# Altium integrated library Lattice CPLD ispLSI.IntLib: 471 symbols (part 16 of 26) (continued)
## ispLSI3320-70LB320
designator U?
In-System Programmable High-Density PLD; Published: 23-Sep-2002; LatestRevisionDate: 13-Apr-2006; LatestRevisionNote: IPC-7351 Footprint Added.; DatasheetVersion: May-1999; PackageVersion: pkg_32, Aug-2005; PackageReference: SBGA320; Publisher: Altium Limited; PackageDescription: 320-Ball Super Ball Grid Array (SBGA320); ComponentLink1Description: Manufacturer Link; ComponentLink1URL: http://www.latticesemi.com/products/mature/index.cfm; ComponentLink2Description: Datasheet; ComponentLink2URL: http://www.latticesemi.com/lit/docs/datasheets/cpld/3320.pdf
footprint SBGA320 (BGA, 320-Leads, Body 31x31mm, Pitch 1.27mm)
3D model 3320-SBGA320 (320-Ball Super Ball Grid Array (SBGA320))
part A pins: A4 I/O144 (io), A5 I/O146 (io), A7 I/O151 (io), A8 I/O154 (io), A10 I/O157 (io), A12 MODE/TMS (in), A13 ~{TRST} (in), A15 I/O1 (io), A17 I/O5 (io), A18 I/O8 (io), A19 I/O9 (io), A21 I/O14 (io), A22 I/O16 (io), AA1 I/O104 (io), AA2 I/O103 (io), AA3 I/O101 (io), AA7 I/O92 (io), AA9 I/O87 (io), AA10 I/O84 (io), AA12 Y0 (in), AA13 Y3 (in), AA15 I/O75 (io), AA16 I/O72 (io), AA17 I/O69 (io), AA20 I/O62 (io), AA22 I/O57 (io), AA23 I/O55 (io), AA24 I/O54 (io), AB2 I/O100 (io), AB3 I/O99 (io), AB4 I/O97 (io), AB6 I/O93 (io), AB7 I/O90 (io), AB9 I/O86 (io), AB10 I/O83 (io), AB11 I/O80 (io), AB13 Y2 (in), AB14 I/O78 (io), AB15 I/O76 (io), AB16 I/O73 (io), AB18 I/O68 (io), AB19 I/O65 (io), AB21 I/O61 (io), AB22 I/O59 (io), AB23 I/O58 (io), AB24 I/O56 (io), AC3 I/O98 (io), AC4 I/O95 (io), AC6 I/O91 (io), AC10 I/O82 (io), AC11 GOE1 (in), AC13 Y1 (in), AC14 I/O79 (io), AC18 I/O70 (io), AC19 I/O67 (io), AC21 I/O63 (io), AC22 I/O60 (io), AD3 I/O96 (io), AD4 I/O94 (io), AD6 I/O89 (io), AD7 I/O88 (io), AD8 I/O85 (io), AD10 I/O81 (io), AD12 GOE0 (in), AD13 Y4 (in), AD15 I/O77 (io), AD17 I/O74 (io), AD18 I/O71 (io), AD20 I/O66 (io), AD21 I/O64 (io), B3 I/O140 (io), B4 I/O143 (io), B6 I/O147 (io), B7 I/O150 (io), B11 I/O159 (io), B12 ~{ispEN}/BSCAN (in), B14 TOE (in), B15 I/O2 (io), B19 I/O11 (io), B21 I/O15 (io), B22 I/O18 (io), C1 I/O137 (io), C2 I/O139 (io), C4 I/O141 (io), C6 I/O145 (io), C7 I/O148 (io), C9 I/O153 (io), C10 I/O156 (io), C11 I/O158 (io), C12 SDI/TDI (in), C14 I/O0 (io), C15 I/O3 (io), C16 I/O6 (io), C18 I/O10 (io), C19 I/O13 (io), C21 I/O17 (io), C22 I/O19 (io), C23 I/O20 (io), D1 I/O135 (io), D2 I/O136 (io), D3 I/O138 (io), D5 I/O142 (io), D8 I/O149 (io), D9 I/O152 (io), D10 I/O155 (io), D12 SCLK/TCK (in), D13 ~{RESET} (in), D15 I/O4 (io), D16 I/O7 (io), D18 I/O12 (io), D22 I/O21 (io), D23 I/O23 (io), D24 I/O24 (io), E21 I/O22 (io), E24 I/O26 (io), F1 I/O130 (io), F2 I/O132 (io), F3 I/O134 (io), F22 I/O25 (io), F23 I/O27 (io), G1 I/O129 (io), G3 I/O131 (io), G4 I/O133 (io), G22 I/O28 (io), G24 I/O30 (io), H1 I/O126 (io), H21 I/O29 (io), H24 I/O33 (io), J3 I/O127 (io), J4 I/O128 (io), J21 I/O31 (io), J22 I/O32 (io), K1 I/O123 (io), K2 I/O124 (io), K4 I/O125 (io), K21 I/O34 (io), K22 I/O35 (io), K24 I/O36 (io), L2 I/O121 (io), L3 I/O122 (io), L22 I/O37 (io), L23 I/O38 (io), M1 I/O120 (io), M4 SDO/TDO (out), M24 I/O39 (io), N1 I/O119 (io), P2 I/O118 (io), P3 I/O117 (io), P22 I/O41 (io), P23 I/O40 (io), R1 I/O116 (io), R3 I/O115 (io), R4 I/O114 (io), R21 I/O44 (io), R23 I/O43 (io), R24 I/O42 (io), T3 I/O112 (io), T4 I/O111 (io), T21 I/O47 (io), T22 I/O46 (io), U1 I/O113 (io), U4 I/O109 (io), U24 I/O45 (io), V1 I/O110 (io), V3 I/O108 (io), V21 I/O52 (io), V22 I/O50 (io), V24 I/O48 (io), W2 I/O107 (io), W3 I/O105 (io), W22 I/O53 (io), W23 I/O51 (io), W24 I/O49 (io), Y1 I/O106 (io), Y4 I/O102 (io)
part B pins: A1 NC, A2 NC, A3 NC, A6 NC, A9 NC, A11 NC, A14 NC, A16 GND (power), A20 NC, A23 NC, A24 NC, AA4 VCC (power), AA5 NC, AA6 GND (power), AA8 NC, AA11 NC, AA14 NC, AA18 NC, AA19 GND (power), AA21 VCC (power), AB1 NC, AB5 NC, AB8 NC, AB12 NC, AB17 GND (power), AB20 NC, AC1 NC, AC2 NC, AC5 NC, AC7 VCC (power), AC8 NC, AC9 NC, AC12 GND (power), AC15 VCC (power), AC16 NC, AC17 NC, AC20 NC, AC23 NC, AC24 NC, AD1 NC, AD2 NC, AD5 NC, AD9 GND (power), AD11 NC, AD14 NC, AD16 NC, AD19 NC, AD22 NC, AD23 NC, AD24 NC, B1 NC, B2 NC, B5 NC, B8 NC, B9 NC, B10 VCC (power), B13 GND (power), B16 NC, B17 NC, B18 VCC (power), B20 NC, B23 NC, B24 NC, C3 VCC (power), C5 NC, C8 GND (power), C13 NC, C17 NC, C20 NC, C24 NC, D4 VCC (power), D6 GND (power), D7 NC, D11 NC, D14 NC, D17 NC, D19 GND (power), D20 NC, D21 VCC (power), E1 NC, E2 NC, E3 NC, E4 NC, E22 NC, E23 NC, F4 GND (power), F21 GND (power), F24 NC, G2 VCC (power), G21 NC, G23 NC, H2 NC, H3 NC, H4 NC, H22 GND (power), H23 NC, J1 GND (power), J2 NC, J23 NC, J24 NC, K3 NC, K23 VCC (power), L1 NC, L4 NC, L21 NC, L24 NC, M2 GND (power), M3 NC, M21 NC, M22 NC, M23 NC, N2 NC, N3 NC, N4 NC, N21 NC, N22 NC, N23 GND (power), N24 NC, P1 NC, P4 NC, P21 NC, P24 NC, R2 VCC (power), R22 NC, T1 NC, T2 NC, T23 NC, T24 GND (power), U2 NC, U3 GND (power), U21 NC, U22 NC, U23 NC, V2 NC, V4 NC, V23 VCC (power), W1 NC, W4 GND (power), W21 GND (power), Y2 NC, Y3 NC, Y21 NC, Y22 NC, Y23 NC, Y24 NC
part A text: J; I; H; A; G; B; F; C; E; D

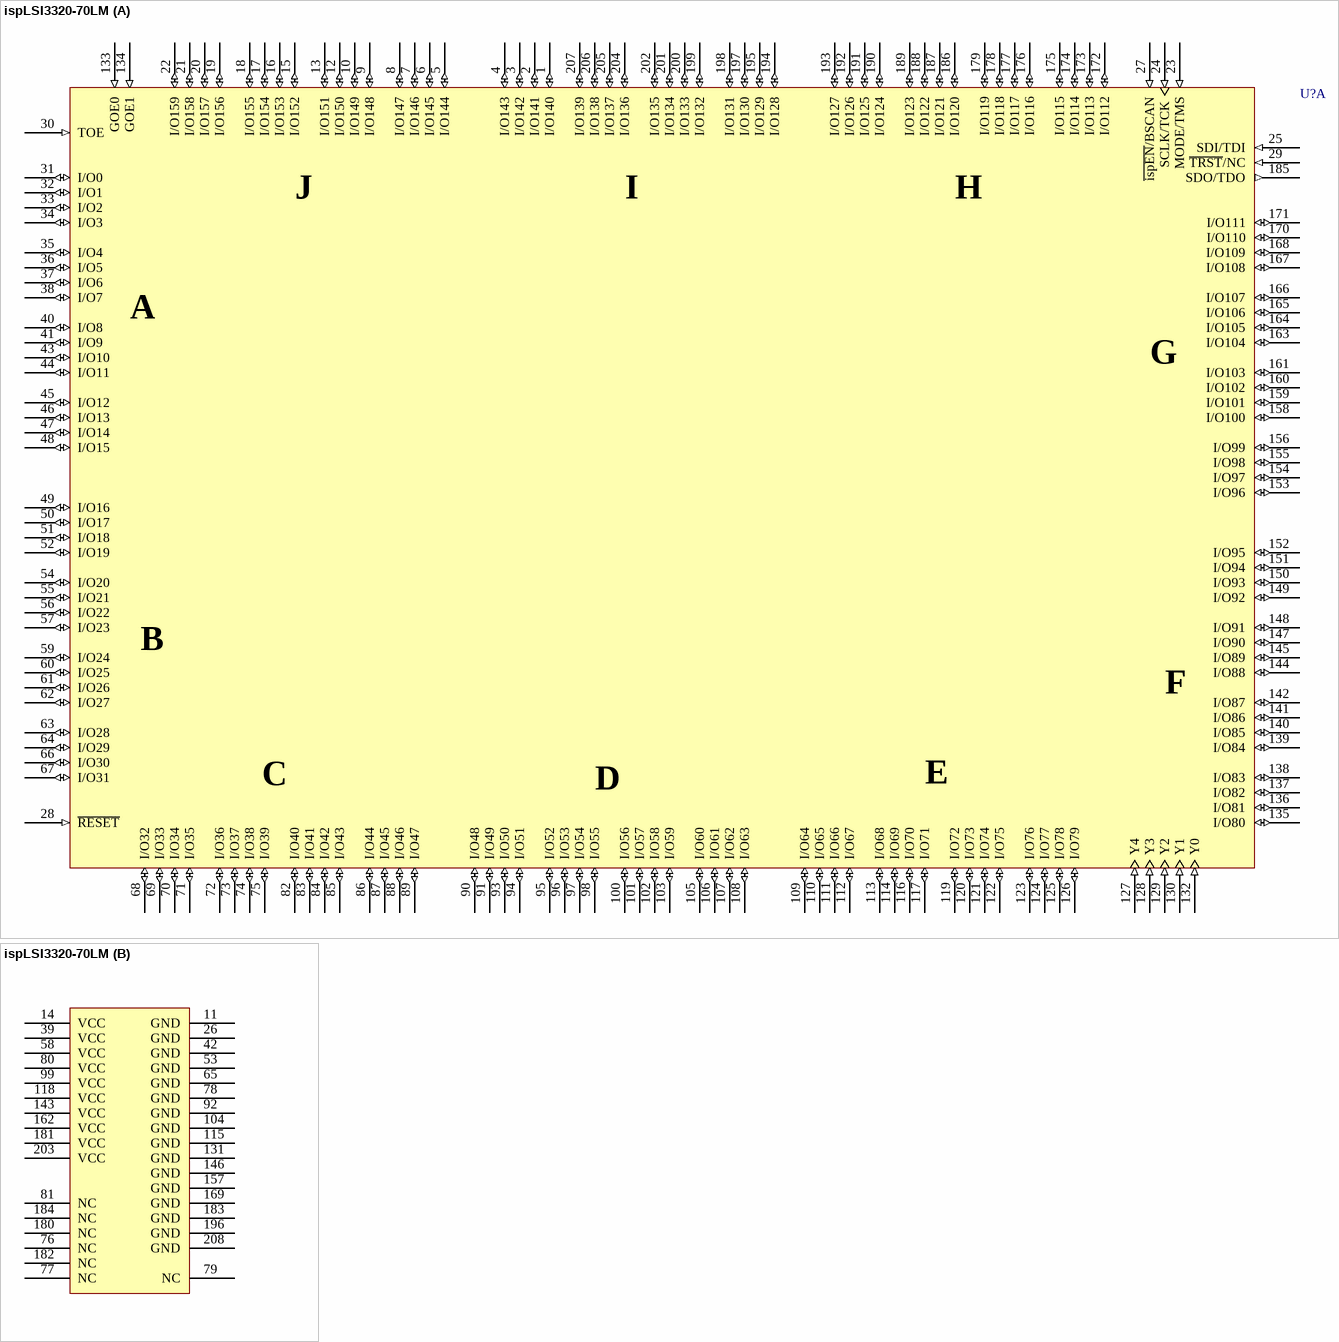
[diagram p149: symbol ispLSI3320-70LM]

## ispLSI3320-70LM
designator U?
In-System Programmable High-Density PLD; Published: 23-Sep-2002; LatestRevisionDate: 13-Apr-2006; LatestRevisionNote: IPC-7351 Footprint Added.; DatasheetVersion: May-1999; PackageVersion: Sep-2000; PackageReference: MQFP208; Publisher: Altium Limited; PackageDescription: 208-Pin Shrink Quad Flat Pack 0.5 mm Pitch; ComponentLink1Description: Manufacturer Link; ComponentLink1URL: http://www.latticesemi.com/products/mature/index.cfm; ComponentLink2Description: Datasheet; ComponentLink2URL: http://www.latticesemi.com/lit/docs/datasheets/cpld/3320.pdf
footprint MQFP208_N (Shrink QFP, 208-Leads, Body 27.7x27.7mm, Pitch 0.5mm, IPC Medium Density)
footprint MQFP208_L (Shrink QFP, 208-Leads, Body 27.7x27.7mm, Pitch 0.5mm, IPC High Density)
footprint MQFP208_M (Shrink QFP, 208-Leads, Body 27.7x27.7mm, Pitch 0.5mm, IPC Low Density)
3D model 3320-MQFP208 (208-Pin Shrink Quad Flat Pack 0.5 mm Pitch)
part A pins: 1 I/O140 (io), 2 I/O141 (io), 3 I/O142 (io), 4 I/O143 (io), 5 I/O144 (io), 6 I/O145 (io), 7 I/O146 (io), 8 I/O147 (io), 9 I/O148 (io), 10 I/O149 (io), 12 I/O150 (io), 13 I/O151 (io), 15 I/O152 (io), 16 I/O153 (io), 17 I/O154 (io), 18 I/O155 (io), 19 I/O156 (io), 20 I/O157 (io), 21 I/O158 (io), 22 I/O159 (io), 23 MODE/TMS (in), 24 SCLK/TCK (in), 25 SDI/TDI (in), 27 ~{ispEN}/BSCAN (in), 28 ~{RESET} (in), 29 ~{TRST}/NC (in), 30 TOE (in), 31 I/O0 (io), 32 I/O1 (io), 33 I/O2 (io), 34 I/O3 (io), 35 I/O4 (io), 36 I/O5 (io), 37 I/O6 (io), 38 I/O7 (io), 40 I/O8 (io), 41 I/O9 (io), 43 I/O10 (io), 44 I/O11 (io), 45 I/O12 (io), 46 I/O13 (io), 47 I/O14 (io), 48 I/O15 (io), 49 I/O16 (io), 50 I/O17 (io), 51 I/O18 (io), 52 I/O19 (io), 54 I/O20 (io), 55 I/O21 (io), 56 I/O22 (io), 57 I/O23 (io), 59 I/O24 (io), 60 I/O25 (io), 61 I/O26 (io), 62 I/O27 (io), 63 I/O28 (io), 64 I/O29 (io), 66 I/O30 (io), 67 I/O31 (io), 68 I/O32 (io), 69 I/O33 (io), 70 I/O34 (io), 71 I/O35 (io), 72 I/O36 (io), 73 I/O37 (io), 74 I/O38 (io), 75 I/O39 (io), 82 I/O40 (io), 83 I/O41 (io), 84 I/O42 (io), 85 I/O43 (io), 86 I/O44 (io), 87 I/O45 (io), 88 I/O46 (io), 89 I/O47 (io), 90 I/O48 (io), 91 I/O49 (io), 93 I/O50 (io), 94 I/O51 (io), 95 I/O52 (io), 96 I/O53 (io), 97 I/O54 (io), 98 I/O55 (io), 100 I/O56 (io), 101 I/O57 (io), 102 I/O58 (io), 103 I/O59 (io), 105 I/O60 (io), 106 I/O61 (io), 107 I/O62 (io), 108 I/O63 (io), 109 I/O64 (io), 110 I/O65 (io), 111 I/O66 (io), 112 I/O67 (io), 113 I/O68 (io), 114 I/O69 (io), 116 I/O70 (io), 117 I/O71 (io), 119 I/O72 (io), 120 I/O73 (io), 121 I/O74 (io), 122 I/O75 (io), 123 I/O76 (io), 124 I/O77 (io), 125 I/O78 (io), 126 I/O79 (io), 127 Y4 (in), 128 Y3 (in), 129 Y2 (in), 130 Y1 (in), 132 Y0 (in), 133 GOE0 (in), 134 GOE1 (in), 135 I/O80 (io), 136 I/O81 (io), 137 I/O82 (io), 138 I/O83 (io), 139 I/O84 (io), 140 I/O85 (io), 141 I/O86 (io), 142 I/O87 (io), 144 I/O88 (io), 145 I/O89 (io), 147 I/O90 (io), 148 I/O91 (io), 149 I/O92 (io), 150 I/O93 (io), 151 I/O94 (io), 152 I/O95 (io), 153 I/O96 (io), 154 I/O97 (io), 155 I/O98 (io), 156 I/O99 (io), 158 I/O100 (io), 159 I/O101 (io), 160 I/O102 (io), 161 I/O103 (io), 163 I/O104 (io), 164 I/O105 (io), 165 I/O106 (io), 166 I/O107 (io), 167 I/O108 (io), 168 I/O109 (io), 170 I/O110 (io), 171 I/O111 (io), 172 I/O112 (io), 173 I/O113 (io), 174 I/O114 (io), 175 I/O115 (io), 176 I/O116 (io), 177 I/O117 (io), 178 I/O118 (io), 179 I/O119 (io), 185 SDO/TDO (out), 186 I/O120 (io), 187 I/O121 (io), 188 I/O122 (io), 189 I/O123 (io), 190 I/O124 (io), 191 I/O125 (io), 192 I/O126 (io), 193 I/O127 (io), 194 I/O128 (io), 195 I/O129 (io), 197 I/O130 (io), 198 I/O131 (io), 199 I/O132 (io), 200 I/O133 (io), 201 I/O134 (io), 202 I/O135 (io), 204 I/O136 (io), 205 I/O137 (io), 206 I/O138 (io), 207 I/O139 (io)
part B pins: 11 GND (power), 14 VCC (power), 26 GND (power), 39 VCC (power), 42 GND (power), 53 GND (power), 58 VCC (power), 65 GND (power), 76 NC, 77 NC, 78 GND (power), 79 NC, 80 VCC (power), 81 NC, 92 GND (power), 99 VCC (power), 104 GND (power), 115 GND (power), 118 VCC (power), 131 GND (power), 143 VCC (power), 146 GND (power), 157 GND (power), 162 VCC (power), 169 GND (power), 180 NC, 181 VCC (power), 182 NC, 183 GND (power), 184 NC, 196 GND (power), 203 VCC (power), 208 GND (power)
part A text: J; I; H; A; G; B; F; C; E; D

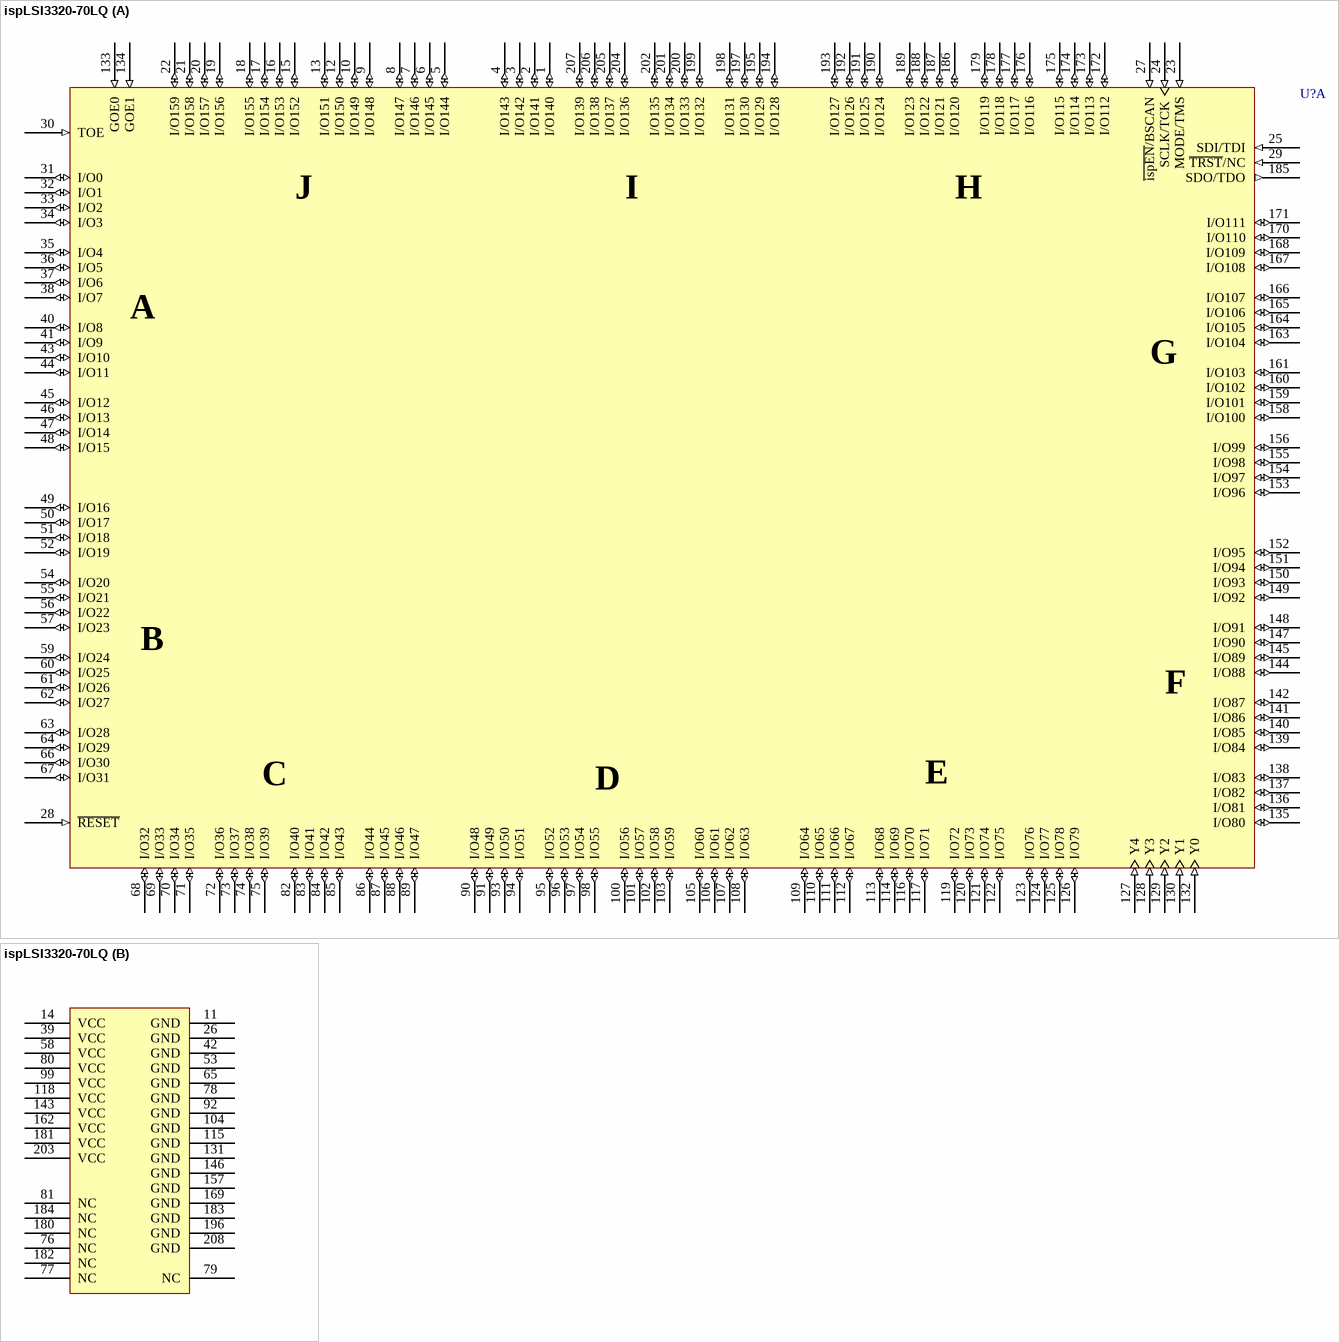
[diagram p150: symbol ispLSI3320-70LQ]

## ispLSI3320-70LQ
designator U?
In-System Programmable High-Density PLD; Published: 23-Sep-2002; LatestRevisionDate: 13-Apr-2006; LatestRevisionNote: IPC-7351 Footprint Added.; DatasheetVersion: May-1999; PackageVersion: pkg_32, Aug-2005; PackageReference: PQFP208; Publisher: Altium Limited; PackageDescription: 208-Pin Plastic Quad Flat Pack (PQFP208); Code_JEDEC: MO-143-FAI; ComponentLink1Description: Manufacturer Link; ComponentLink1URL: http://www.latticesemi.com/products/mature/index.cfm; ComponentLink2Description: Datasheet; ComponentLink2URL: http://www.latticesemi.com/lit/docs/datasheets/cpld/3320.pdf
footprint PQFP208_N (Shrink QFP, 208-Leads, Body 28x28mm, Pitch 0.5mm, IPC Medium Density)
footprint PQFP208_L (Shrink QFP, 208-Leads, Body 28x28mm, Pitch 0.5mm, IPC High Density)
footprint PQFP208_M (Shrink QFP, 208-Leads, Body 28x28mm, Pitch 0.5mm, IPC Low Density)
3D model 3320-PQFP208 (208-Pin Plastic Quad Flat Pack (PQFP208))
part A pins: 1 I/O140 (io), 2 I/O141 (io), 3 I/O142 (io), 4 I/O143 (io), 5 I/O144 (io), 6 I/O145 (io), 7 I/O146 (io), 8 I/O147 (io), 9 I/O148 (io), 10 I/O149 (io), 12 I/O150 (io), 13 I/O151 (io), 15 I/O152 (io), 16 I/O153 (io), 17 I/O154 (io), 18 I/O155 (io), 19 I/O156 (io), 20 I/O157 (io), 21 I/O158 (io), 22 I/O159 (io), 23 MODE/TMS (in), 24 SCLK/TCK (in), 25 SDI/TDI (in), 27 ~{ispEN}/BSCAN (in), 28 ~{RESET} (in), 29 ~{TRST}/NC (in), 30 TOE (in), 31 I/O0 (io), 32 I/O1 (io), 33 I/O2 (io), 34 I/O3 (io), 35 I/O4 (io), 36 I/O5 (io), 37 I/O6 (io), 38 I/O7 (io), 40 I/O8 (io), 41 I/O9 (io), 43 I/O10 (io), 44 I/O11 (io), 45 I/O12 (io), 46 I/O13 (io), 47 I/O14 (io), 48 I/O15 (io), 49 I/O16 (io), 50 I/O17 (io), 51 I/O18 (io), 52 I/O19 (io), 54 I/O20 (io), 55 I/O21 (io), 56 I/O22 (io), 57 I/O23 (io), 59 I/O24 (io), 60 I/O25 (io), 61 I/O26 (io), 62 I/O27 (io), 63 I/O28 (io), 64 I/O29 (io), 66 I/O30 (io), 67 I/O31 (io), 68 I/O32 (io), 69 I/O33 (io), 70 I/O34 (io), 71 I/O35 (io), 72 I/O36 (io), 73 I/O37 (io), 74 I/O38 (io), 75 I/O39 (io), 82 I/O40 (io), 83 I/O41 (io), 84 I/O42 (io), 85 I/O43 (io), 86 I/O44 (io), 87 I/O45 (io), 88 I/O46 (io), 89 I/O47 (io), 90 I/O48 (io), 91 I/O49 (io), 93 I/O50 (io), 94 I/O51 (io), 95 I/O52 (io), 96 I/O53 (io), 97 I/O54 (io), 98 I/O55 (io), 100 I/O56 (io), 101 I/O57 (io), 102 I/O58 (io), 103 I/O59 (io), 105 I/O60 (io), 106 I/O61 (io), 107 I/O62 (io), 108 I/O63 (io), 109 I/O64 (io), 110 I/O65 (io), 111 I/O66 (io), 112 I/O67 (io), 113 I/O68 (io), 114 I/O69 (io), 116 I/O70 (io), 117 I/O71 (io), 119 I/O72 (io), 120 I/O73 (io), 121 I/O74 (io), 122 I/O75 (io), 123 I/O76 (io), 124 I/O77 (io), 125 I/O78 (io), 126 I/O79 (io), 127 Y4 (in), 128 Y3 (in), 129 Y2 (in), 130 Y1 (in), 132 Y0 (in), 133 GOE0 (in), 134 GOE1 (in), 135 I/O80 (io), 136 I/O81 (io), 137 I/O82 (io), 138 I/O83 (io), 139 I/O84 (io), 140 I/O85 (io), 141 I/O86 (io), 142 I/O87 (io), 144 I/O88 (io), 145 I/O89 (io), 147 I/O90 (io), 148 I/O91 (io), 149 I/O92 (io), 150 I/O93 (io), 151 I/O94 (io), 152 I/O95 (io), 153 I/O96 (io), 154 I/O97 (io), 155 I/O98 (io), 156 I/O99 (io), 158 I/O100 (io), 159 I/O101 (io), 160 I/O102 (io), 161 I/O103 (io), 163 I/O104 (io), 164 I/O105 (io), 165 I/O106 (io), 166 I/O107 (io), 167 I/O108 (io), 168 I/O109 (io), 170 I/O110 (io), 171 I/O111 (io), 172 I/O112 (io), 173 I/O113 (io), 174 I/O114 (io), 175 I/O115 (io), 176 I/O116 (io), 177 I/O117 (io), 178 I/O118 (io), 179 I/O119 (io), 185 SDO/TDO (out), 186 I/O120 (io), 187 I/O121 (io), 188 I/O122 (io), 189 I/O123 (io), 190 I/O124 (io), 191 I/O125 (io), 192 I/O126 (io), 193 I/O127 (io), 194 I/O128 (io), 195 I/O129 (io), 197 I/O130 (io), 198 I/O131 (io), 199 I/O132 (io), 200 I/O133 (io), 201 I/O134 (io), 202 I/O135 (io), 204 I/O136 (io), 205 I/O137 (io), 206 I/O138 (io), 207 I/O139 (io)
part B pins: 11 GND (power), 14 VCC (power), 26 GND (power), 39 VCC (power), 42 GND (power), 53 GND (power), 58 VCC (power), 65 GND (power), 76 NC, 77 NC, 78 GND (power), 79 NC, 80 VCC (power), 81 NC, 92 GND (power), 99 VCC (power), 104 GND (power), 115 GND (power), 118 VCC (power), 131 GND (power), 143 VCC (power), 146 GND (power), 157 GND (power), 162 VCC (power), 169 GND (power), 180 NC, 181 VCC (power), 182 NC, 183 GND (power), 184 NC, 196 GND (power), 203 VCC (power), 208 GND (power)
part A text: J; I; H; A; G; B; F; C; E; D

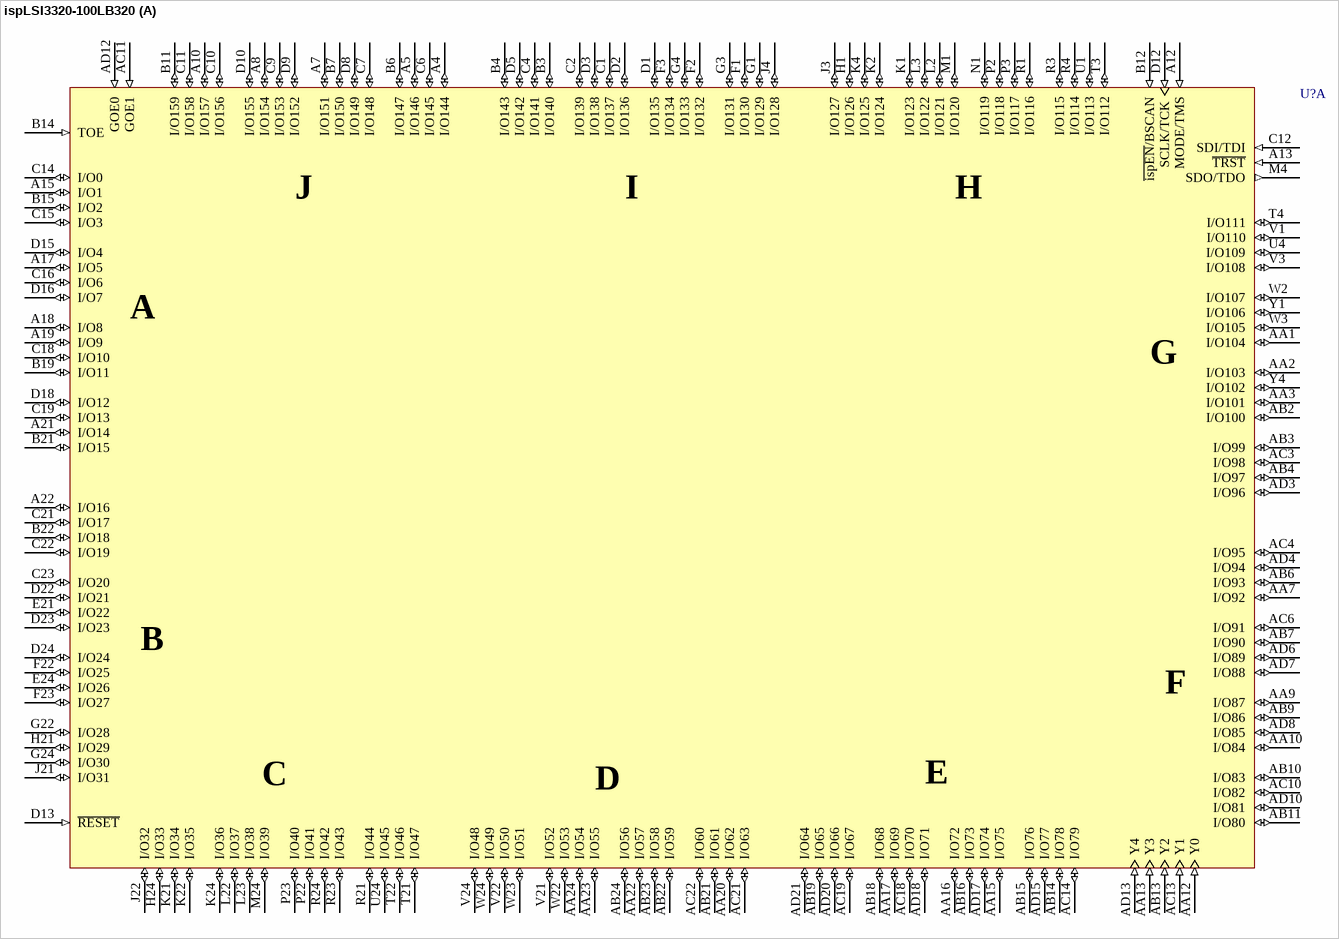
[diagram p151: symbol ispLSI3320-100LB320]

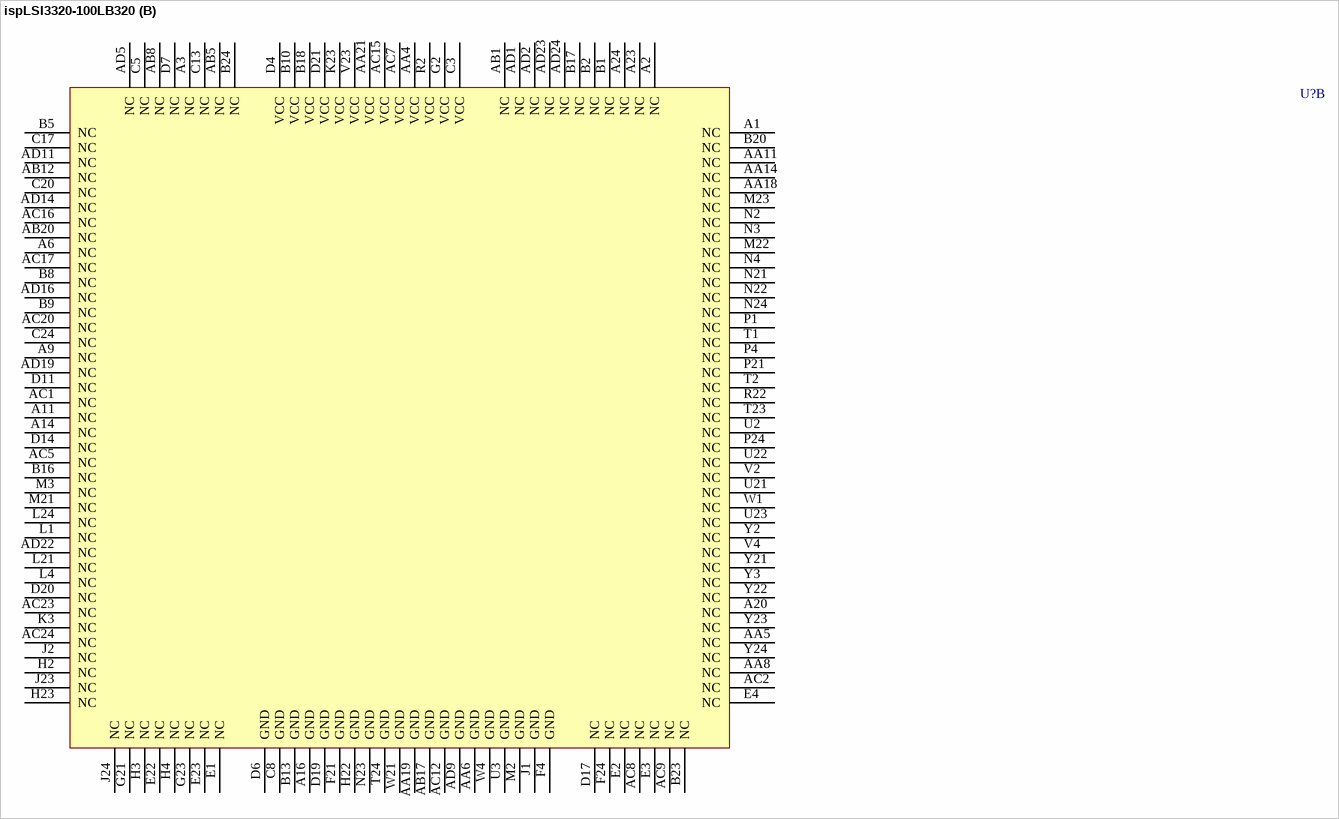
[diagram p152: symbol ispLSI3320-100LB320]

## ispLSI3320-100LB320
designator U?
In-System Programmable High-Density PLD; Published: 23-Sep-2002; LatestRevisionDate: 13-Apr-2006; LatestRevisionNote: IPC-7351 Footprint Added.; DatasheetVersion: May-1999; PackageVersion: pkg_32, Aug-2005; PackageReference: SBGA320; Publisher: Altium Limited; PackageDescription: 320-Ball Super Ball Grid Array (SBGA320); ComponentLink1Description: Manufacturer Link; ComponentLink1URL: http://www.latticesemi.com/products/mature/index.cfm; ComponentLink2Description: Datasheet; ComponentLink2URL: http://www.latticesemi.com/lit/docs/datasheets/cpld/3320.pdf
footprint SBGA320 (BGA, 320-Leads, Body 31x31mm, Pitch 1.27mm)
3D model 3320-SBGA320 (320-Ball Super Ball Grid Array (SBGA320))
part A pins: A4 I/O144 (io), A5 I/O146 (io), A7 I/O151 (io), A8 I/O154 (io), A10 I/O157 (io), A12 MODE/TMS (in), A13 ~{TRST} (in), A15 I/O1 (io), A17 I/O5 (io), A18 I/O8 (io), A19 I/O9 (io), A21 I/O14 (io), A22 I/O16 (io), AA1 I/O104 (io), AA2 I/O103 (io), AA3 I/O101 (io), AA7 I/O92 (io), AA9 I/O87 (io), AA10 I/O84 (io), AA12 Y0 (in), AA13 Y3 (in), AA15 I/O75 (io), AA16 I/O72 (io), AA17 I/O69 (io), AA20 I/O62 (io), AA22 I/O57 (io), AA23 I/O55 (io), AA24 I/O54 (io), AB2 I/O100 (io), AB3 I/O99 (io), AB4 I/O97 (io), AB6 I/O93 (io), AB7 I/O90 (io), AB9 I/O86 (io), AB10 I/O83 (io), AB11 I/O80 (io), AB13 Y2 (in), AB14 I/O78 (io), AB15 I/O76 (io), AB16 I/O73 (io), AB18 I/O68 (io), AB19 I/O65 (io), AB21 I/O61 (io), AB22 I/O59 (io), AB23 I/O58 (io), AB24 I/O56 (io), AC3 I/O98 (io), AC4 I/O95 (io), AC6 I/O91 (io), AC10 I/O82 (io), AC11 GOE1 (in), AC13 Y1 (in), AC14 I/O79 (io), AC18 I/O70 (io), AC19 I/O67 (io), AC21 I/O63 (io), AC22 I/O60 (io), AD3 I/O96 (io), AD4 I/O94 (io), AD6 I/O89 (io), AD7 I/O88 (io), AD8 I/O85 (io), AD10 I/O81 (io), AD12 GOE0 (in), AD13 Y4 (in), AD15 I/O77 (io), AD17 I/O74 (io), AD18 I/O71 (io), AD20 I/O66 (io), AD21 I/O64 (io), B3 I/O140 (io), B4 I/O143 (io), B6 I/O147 (io), B7 I/O150 (io), B11 I/O159 (io), B12 ~{ispEN}/BSCAN (in), B14 TOE (in), B15 I/O2 (io), B19 I/O11 (io), B21 I/O15 (io), B22 I/O18 (io), C1 I/O137 (io), C2 I/O139 (io), C4 I/O141 (io), C6 I/O145 (io), C7 I/O148 (io), C9 I/O153 (io), C10 I/O156 (io), C11 I/O158 (io), C12 SDI/TDI (in), C14 I/O0 (io), C15 I/O3 (io), C16 I/O6 (io), C18 I/O10 (io), C19 I/O13 (io), C21 I/O17 (io), C22 I/O19 (io), C23 I/O20 (io), D1 I/O135 (io), D2 I/O136 (io), D3 I/O138 (io), D5 I/O142 (io), D8 I/O149 (io), D9 I/O152 (io), D10 I/O155 (io), D12 SCLK/TCK (in), D13 ~{RESET} (in), D15 I/O4 (io), D16 I/O7 (io), D18 I/O12 (io), D22 I/O21 (io), D23 I/O23 (io), D24 I/O24 (io), E21 I/O22 (io), E24 I/O26 (io), F1 I/O130 (io), F2 I/O132 (io), F3 I/O134 (io), F22 I/O25 (io), F23 I/O27 (io), G1 I/O129 (io), G3 I/O131 (io), G4 I/O133 (io), G22 I/O28 (io), G24 I/O30 (io), H1 I/O126 (io), H21 I/O29 (io), H24 I/O33 (io), J3 I/O127 (io), J4 I/O128 (io), J21 I/O31 (io), J22 I/O32 (io), K1 I/O123 (io), K2 I/O124 (io), K4 I/O125 (io), K21 I/O34 (io), K22 I/O35 (io), K24 I/O36 (io), L2 I/O121 (io), L3 I/O122 (io), L22 I/O37 (io), L23 I/O38 (io), M1 I/O120 (io), M4 SDO/TDO (out), M24 I/O39 (io), N1 I/O119 (io), P2 I/O118 (io), P3 I/O117 (io), P22 I/O41 (io), P23 I/O40 (io), R1 I/O116 (io), R3 I/O115 (io), R4 I/O114 (io), R21 I/O44 (io), R23 I/O43 (io), R24 I/O42 (io), T3 I/O112 (io), T4 I/O111 (io), T21 I/O47 (io), T22 I/O46 (io), U1 I/O113 (io), U4 I/O109 (io), U24 I/O45 (io), V1 I/O110 (io), V3 I/O108 (io), V21 I/O52 (io), V22 I/O50 (io), V24 I/O48 (io), W2 I/O107 (io), W3 I/O105 (io), W22 I/O53 (io), W23 I/O51 (io), W24 I/O49 (io), Y1 I/O106 (io), Y4 I/O102 (io)
part B pins: A1 NC, A2 NC, A3 NC, A6 NC, A9 NC, A11 NC, A14 NC, A16 GND (power), A20 NC, A23 NC, A24 NC, AA4 VCC (power), AA5 NC, AA6 GND (power), AA8 NC, AA11 NC, AA14 NC, AA18 NC, AA19 GND (power), AA21 VCC (power), AB1 NC, AB5 NC, AB8 NC, AB12 NC, AB17 GND (power), AB20 NC, AC1 NC, AC2 NC, AC5 NC, AC7 VCC (power), AC8 NC, AC9 NC, AC12 GND (power), AC15 VCC (power), AC16 NC, AC17 NC, AC20 NC, AC23 NC, AC24 NC, AD1 NC, AD2 NC, AD5 NC, AD9 GND (power), AD11 NC, AD14 NC, AD16 NC, AD19 NC, AD22 NC, AD23 NC, AD24 NC, B1 NC, B2 NC, B5 NC, B8 NC, B9 NC, B10 VCC (power), B13 GND (power), B16 NC, B17 NC, B18 VCC (power), B20 NC, B23 NC, B24 NC, C3 VCC (power), C5 NC, C8 GND (power), C13 NC, C17 NC, C20 NC, C24 NC, D4 VCC (power), D6 GND (power), D7 NC, D11 NC, D14 NC, D17 NC, D19 GND (power), D20 NC, D21 VCC (power), E1 NC, E2 NC, E3 NC, E4 NC, E22 NC, E23 NC, F4 GND (power), F21 GND (power), F24 NC, G2 VCC (power), G21 NC, G23 NC, H2 NC, H3 NC, H4 NC, H22 GND (power), H23 NC, J1 GND (power), J2 NC, J23 NC, J24 NC, K3 NC, K23 VCC (power), L1 NC, L4 NC, L21 NC, L24 NC, M2 GND (power), M3 NC, M21 NC, M22 NC, M23 NC, N2 NC, N3 NC, N4 NC, N21 NC, N22 NC, N23 GND (power), N24 NC, P1 NC, P4 NC, P21 NC, P24 NC, R2 VCC (power), R22 NC, T1 NC, T2 NC, T23 NC, T24 GND (power), U2 NC, U3 GND (power), U21 NC, U22 NC, U23 NC, V2 NC, V4 NC, V23 VCC (power), W1 NC, W4 GND (power), W21 GND (power), Y2 NC, Y3 NC, Y21 NC, Y22 NC, Y23 NC, Y24 NC
